# Altium footprint library Elettronica FM.PcbLib: 387 footprints (part 8 of 25)
Each footprint in its own frame and in the unit in brackets; x right, y up, seen from the top. Pads: shape width x height; smd on the part's side, far side on the other; paste and mask are expansions set on the pad; w line width, h text height; cw(c..) or ccw(c..) is an arc to the next point about the centre after c.
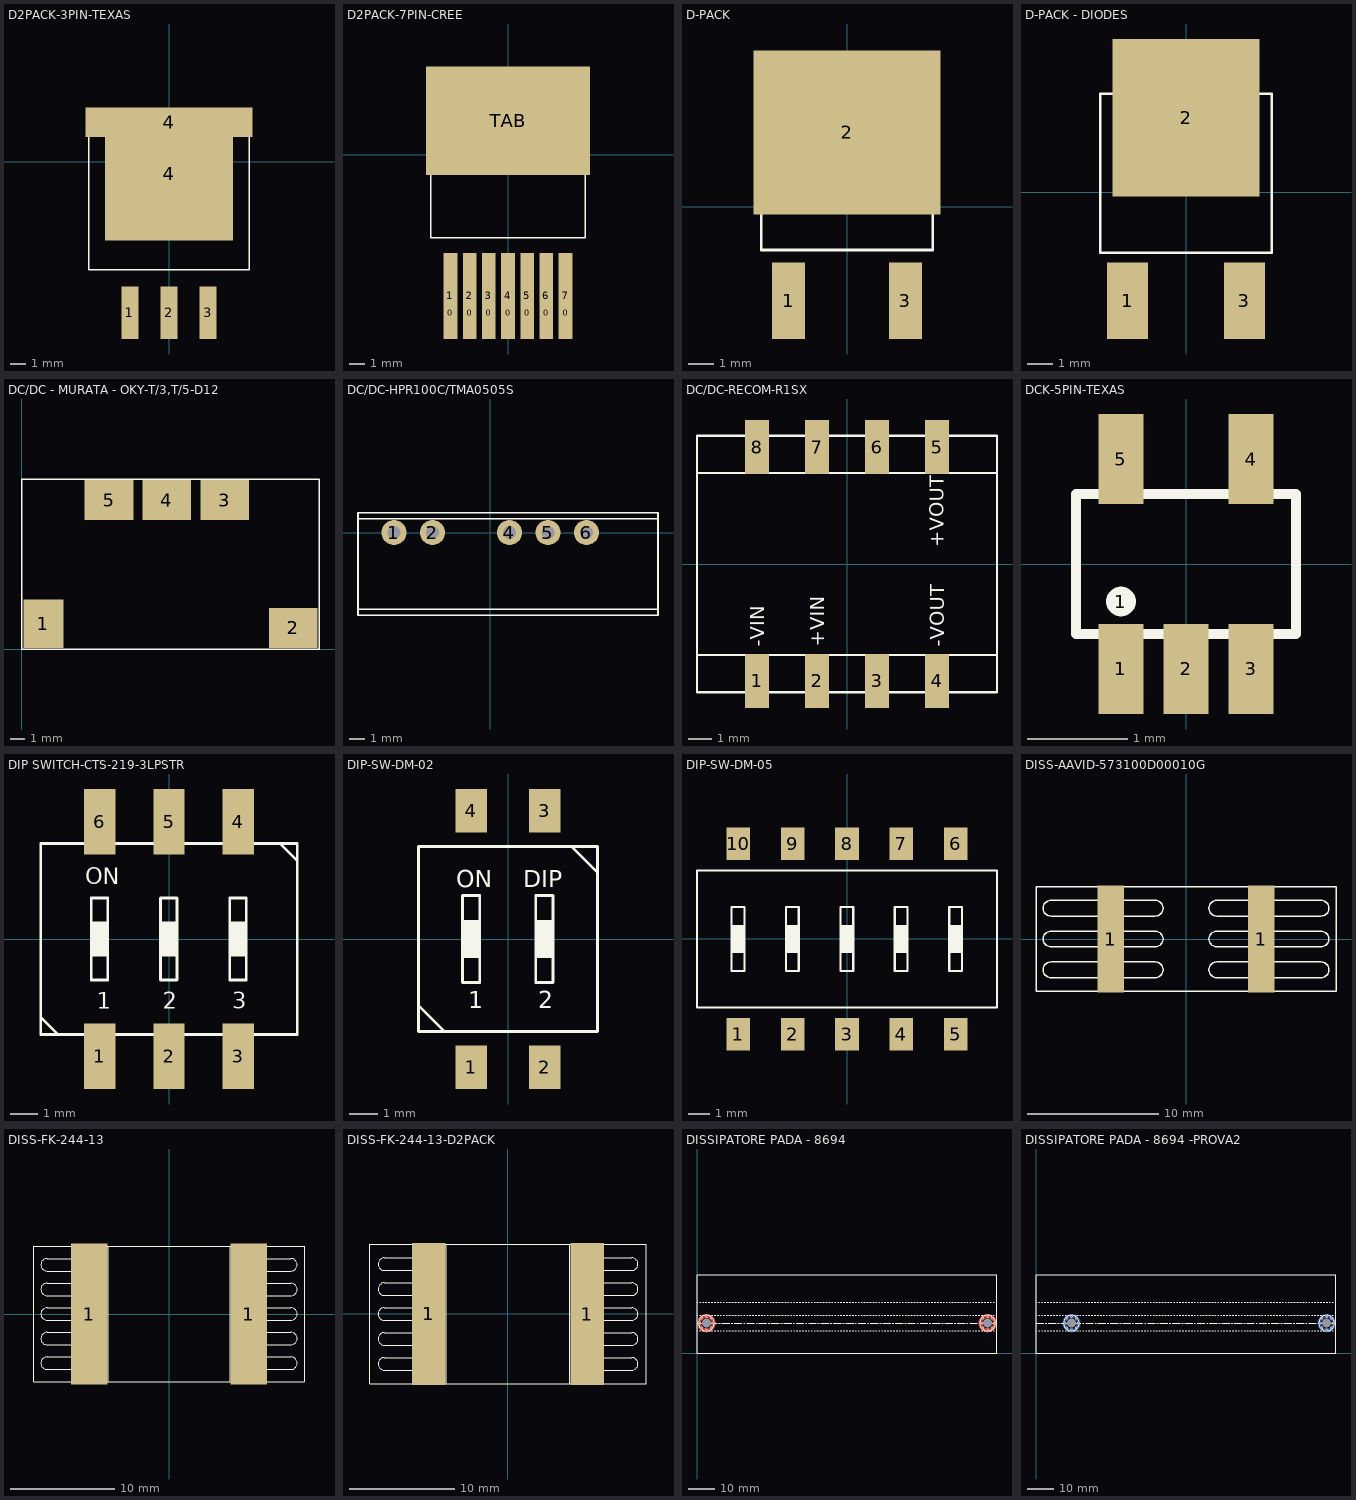
[diagram p7: the footprints below, top view; thin cyan lines are the x and y axes]

## D2PACK-3PIN-TEXAS [mm]
pads (5):
  rect 1.1x3.4 smd: 1(-2.54,-9.8) 2(0,-9.8) 3(2.54,-9.8)
  rect 8.3x8.6 smd: 4(0,-0.8)
  rect 10.8x1.9 smd: 4(0,2.55)
Top Overlay:
  lines w0.1: -5.2,1.9 -5.2,3.2 5.2,3.2 5.2,1.9 ; -5.2,1.9 5.2,1.9 ; -5.2,1.9 -5.2,-7 5.2,-7 5.2,1.9
3D body: height 3.25, standoff 2.6, extent 2.095,-9.075 2.955,-6.275
3D body: height 3.25, standoff 0, extent 2.095,-9.075 2.955,-8.425
3D body: height 0.65, standoff 0, extent 2.095,-11.125 2.955,-8.425
3D body: height 0.65, standoff 0, extent -2.955,-11.125 -2.095,-8.425
3D body: height 3.25, standoff 0, extent -2.955,-9.075 -2.095,-8.425
3D body: height 3.25, standoff 2.6, extent -2.955,-9.075 -2.095,-6.275
3D body: height 4.6, standoff 0, extent -5.2,-7.5 5.2,1.9
3D body: height 1.4, standoff 0, extent -5.2,1.9 5.2,3.2
3D body: height 3.25, standoff 2.6, extent -0.415,-9.075 0.445,-6.275
3D body: height 3.25, standoff 0, extent -0.415,-9.075 0.445,-8.425
3D body: height 0.65, standoff 0, extent -0.415,-11.125 0.445,-8.425

## D2PACK-7PIN-CREE [mm]
pads (15):
  rect 0.7x2.7 on Top Overlay mask+0.1: 0(-3.81,-10.45) 0(-2.54,-10.45) 0(-1.27,-10.45) 0(0,-10.45) 0(1.27,-10.45) 0(2.54,-10.45) 0(3.81,-10.45)
  rect 0.9x5.7 smd: 1(-3.81,-9.35) 2(-2.54,-9.35) 3(-1.27,-9.35) 4(0,-9.35) 5(1.27,-9.35) 6(2.54,-9.35) 7(3.81,-9.35)
  rect 10.85x7.2 smd mask-500: TAB(0,2.25)
Top Overlay:
  lines w0.1: -5.125,3.6 5.125,3.6 ; -3.85,-0.95 -3.85,-1.25 -3.55,-1.25 ; -3.85,-0.65 -3.85,-0.35 ; -3.85,-0.05 -3.85,0.25 ; -3.85,0.55 -3.85,0.85 ; -3.85,1.15 -3.85,1.45 ; -3.85,1.75 -3.85,2.05 ; -3.85,2.35 -3.85,2.65 ; -3.85,2.95 -3.85,3.25 ; -3.85,3.55 -3.85,3.6 ; -3.65,-1.25 -3.35,-1.25 ; -3.05,-1.25 -2.75,-1.25 ; -2.45,-1.25 -2.15,-1.25 ; -1.85,-1.25 -1.55,-1.25 ; -1.25,-1.25 -0.95,-1.25 ; -0.65,-1.25 -0.35,-1.25 ; -0.05,-1.25 0.25,-1.25 ; 0.55,-1.25 0.85,-1.25 ; 1.15,-1.25 1.45,-1.25 ; 1.75,-1.25 2.05,-1.25 ; 2.35,-1.25 2.65,-1.25 ; 2.95,-1.25 3.25,-1.25 ; 3.55,-1.25 3.85,-1.25 3.85,-0.95 ; 3.85,-0.65 3.85,-0.35 ; 3.85,-0.05 3.85,0.25 ; 3.85,0.55 3.85,0.85 ; 3.85,1.15 3.85,1.45 ; 3.85,1.75 3.85,2.05 ; 3.85,2.35 3.85,2.65 ; 3.85,2.95 3.85,3.25 ; 3.85,3.55 3.85,3.6 ; -5.125,-5.5 5.125,-5.5 5.125,5 4.625,5.5 -4.625,5.5 -5.125,5 -5.125,-5.5
Top Solder:
  region: -5.425,5.85 5.425,5.85 5.425,3.5 3.95,3.5 3.95,-1.35 -3.95,-1.35 -3.95,3.5 -5.425,3.5
3D body: height 0.65, standoff 0, extent -4.16,-11.8 -3.46,-9.1
3D body: height 3.25, standoff 0, extent -4.16,-9.75 -3.46,-9.1
3D body: height 3.25, standoff 2.6, extent -4.16,-9.75 -3.46,-5.5
3D body: height 0.65, standoff 0, extent -2.89,-11.8 -2.19,-9.1
3D body: height 3.25, standoff 0, extent -2.89,-9.75 -2.19,-9.1
3D body: height 3.25, standoff 2.6, extent -2.89,-9.75 -2.19,-5.5
3D body: height 0.65, standoff 0, extent -1.62,-11.8 -0.92,-9.1
3D body: height 3.25, standoff 0, extent -1.62,-9.75 -0.92,-9.1
3D body: height 3.25, standoff 2.6, extent -1.62,-9.75 -0.92,-5.5
3D body: height 0.65, standoff 0, extent 3.46,-11.8 4.16,-9.1
3D body: height 3.25, standoff 0, extent 3.46,-9.75 4.16,-9.1
3D body: height 3.25, standoff 2.6, extent 3.46,-9.75 4.16,-5.5
3D body: height 0.65, standoff 0, extent 2.19,-11.8 2.89,-9.1
3D body: height 3.25, standoff 0, extent 2.19,-9.75 2.89,-9.1
3D body: height 3.25, standoff 2.6, extent 2.19,-9.75 2.89,-5.5
3D body: height 0.65, standoff 0, extent 0.92,-11.8 1.62,-9.1
3D body: height 3.25, standoff 0, extent 0.92,-9.75 1.62,-9.1
3D body: height 3.25, standoff 2.6, extent 0.92,-9.75 1.62,-5.5
3D body: height 3.25, standoff 2.6, extent -0.35,-9.75 0.35,-5.5
3D body: height 3.25, standoff 0, extent -0.35,-9.75 0.35,-9.1
3D body: height 1.4, standoff 0, extent -5.125,3.6 5.125,5.5
3D body: height 4.6, standoff 0, extent -5.125,-5.5 5.125,3.6
3D body: height 0.65, standoff 0, extent -0.35,-11.8 0.35,-9.1

## D-PACK [mm]
pads (3):
  rect 1.3x3 smd: 1(-2.3,-3.7) 3(2.3,-3.7)
  rect 7.35x6.45 smd mask-50: 2(0,2.925)
Top Overlay:
  lines w0.1: -3.375,4.55 3.375,4.55 ; -2.6,0.15 -2.6,0 -2.275,0 ; -2.6,0.35 -2.6,0.55 ; -2.6,0.75 -2.6,0.95 ; -2.6,1.15 -2.6,1.35 ; -2.6,1.55 -2.6,1.75 ; -2.6,1.95 -2.6,2.15 ; -2.6,2.35 -2.6,2.55 ; -2.6,2.75 -2.6,2.95 ; -2.6,3.15 -2.6,3.35 ; -2.6,3.55 -2.6,3.75 ; -2.6,3.95 -2.6,4.15 ; -2.6,4.35 -2.6,4.55 ; -2.075,0 -1.875,0 ; -1.675,0 -1.475,0 ; -1.275,0 -1.075,0 ; -0.875,0 -0.675,0 ; -0.475,0 -0.275,0 ; -0.075,0 0.125,0 ; 0.325,0 0.525,0 ; 0.725,0 0.925,0 ; 1.125,0 1.325,0 ; 1.525,0 1.725,0 ; 1.925,0 2.125,0 ; 2.325,0 2.6,0 2.6,0.15 ; 2.6,0.35 2.6,0.55 ; 2.6,0.75 2.6,0.95 ; 2.6,1.15 2.6,1.35 ; 2.6,1.55 2.6,1.75 ; 2.6,1.95 2.6,2.15 ; 2.6,2.35 2.6,2.55 ; 2.6,2.75 2.6,2.95 ; 2.6,3.15 2.6,3.35 ; 2.6,3.55 2.6,3.75 ; 2.6,3.95 2.6,4.15 ; 2.6,4.35 2.6,4.55 ; -3.375,-1.7 3.375,-1.7 3.375,5.85 -3.375,5.85 -3.375,-1.7
Top Solder:
  region: -3.775,4.45 -2.7,4.45 -2.7,-0.1 2.7,-0.1 2.7,4.45 3.775,4.45 3.775,6.25 -3.775,6.25
3D body: height 1.58, standoff 0, extent 1.85,-3.45 2.75,-2.85
3D body: height 1.58, standoff 0.97, extent 1.85,-3.45 2.75,-1.475
3D body: height 1.58, standoff 0.97, extent -2.75,-3.45 -1.85,-1.475
3D body: height 1.58, standoff 0, extent -2.75,-3.45 -1.85,-2.85
3D body: height 0.6, standoff 0, extent 1.85,-4.65 2.75,-2.85
3D body: height 2.55, standoff 0, extent -3.375,-1.7 3.375,4.55
3D body: height 1.15, standoff 0, extent -3.375,4.55 3.375,5.85
3D body: height 0.6, standoff 0, extent -2.75,-4.65 -1.85,-2.85

## D-PACK - DIODES [mm]
pads (3):
  rect 1.6x3 smd: 1(-2.3,-4.275) 3(2.3,-4.275)
  rect 5.8x6.2 smd mask+0.1: 2(0,2.925)
Top Overlay:
  lines w0.1: -2.725,3.875 -2.725,5.525 2.725,5.525 2.725,3.875 ; -3.375,-2.375 3.375,-2.375 3.375,3.875 -3.375,3.875 -3.375,-2.375
3D body: height 1.58, standoff 0, extent 1.85,-3.675 2.75,-3.075
3D body: height 1.58, standoff 0.97, extent 1.85,-3.675 2.75,-2.15
3D body: height 1.58, standoff 0.97, extent -2.75,-3.675 -1.85,-2.15
3D body: height 1.58, standoff 0, extent -2.75,-3.675 -1.85,-3.075
3D body: height 0.6, standoff 0, extent 1.85,-4.875 2.75,-3.075
3D body: height 2.55, standoff 0, extent -3.375,-2.375 3.375,3.875
3D body: height 1.15, standoff 0, extent -2.725,3.875 2.725,5.525
3D body: height 0.6, standoff 0, extent -2.75,-4.875 -1.85,-3.075

## DC/DC - MURATA - OKY-T/3,T/5-D12 [mm]
height 1.9
pads (5):
  rect 2.8x3.4 smd mask+0.1: 1(1.5,1.8)
  rect 3.4x2.8 smd mask+0.1: 2(19,1.5) 3(14.2,10.45) 4(10.15,10.45) 5(6.1,10.45)
Top Overlay:
  lines w0.1: 0,0 20.8,0 20.8,11.9 0,11.9 0,0
3D body: height 7, standoff 0, extent 0,0 20.8,11.9

## DC/DC-HPR100C/TMA0505S [mm]
height 1.9
pads (5):
  round 1.65 hole 0.85: 1(-6.35,0) 2(-3.81,0) 4(1.27,0) 5(3.81,0) 6(6.35,0)
Top Overlay:
  lines w0.1: -8.725,-5.05 11.075,-5.05 ; -8.725,0.9 -8.725,-5.45 11.075,-5.45 11.075,0.9 ; -8.725,0.9 11.075,0.9 ; -8.725,0.9 -8.725,1.3 11.075,1.3 11.075,0.9
3D body: height 10.45, standoff 0, extent -8.6,-4.925 10.95,1.175
3D body: height 10.45, standoff 0, extent -8.6,-5.325 10.95,0.775

## DC/DC-RECOM-R1SX [mm]
height 1.9
pads (8):
  rect 1x2.3 smd paste+0 mask+0.05: 1(-3.81,-4.95) 2(-1.27,-4.95) 3(1.27,-4.95) 4(3.81,-4.95) 5(3.81,4.95) 6(1.27,4.95) 7(-1.27,4.95) 8(-3.81,4.95)
Top Overlay:
  lines w0.1: -4.175,-3.85 -4.175,-5.6 -3.45,-5.6 -3.45,-3.85 ; -4.17,3.85 -4.17,5.6 -3.445,5.6 -3.445,3.85 ; -1.635,-3.85 -1.635,-5.6 -0.91,-5.6 -0.91,-3.85 ; 3.445,-3.85 3.445,-5.6 4.17,-5.6 4.17,-3.85 ; 3.45,3.85 3.45,5.6 4.175,5.6 4.175,3.85 ; -6.35,-3.85 6.35,-3.85 ; -6.35,-3.85 -6.35,3.85 ; -6.35,-3.85 -6.35,-5.425 6.35,-5.425 6.35,-3.85 ; -6.35,3.85 6.35,3.85 ; -6.35,3.85 -6.35,5.425 6.35,5.425 6.35,3.85 ; 6.35,-3.85 6.35,3.85
  text "+VOUT" at 4.1,0.7 h0.6
  text "-VOUT" at 4.12,-3.5 h0.6
  text "+VIN" at -0.96,-3.5 h0.6
  text "-VIN" at -3.5,-3.5 h0.6
3D body: height 7, standoff 0, extent -6.35,-3.85 6.35,3.85

## DCK-5PIN-TEXAS [mm]
height 1.9
pads (6):
  rect 0.45x0.9 smd paste-0.05 mask+0.05: 1(-0.65,-1.05) 2(0,-1.05) 3(0.65,-1.05) 4(0.65,1.05) 5(-0.65,1.05)
  round 0.3 on Top Overlay mask+0.1: 1(-0.65,-0.375)
Top Overlay:
  lines w0.1: -1.1,-0.7 -1.1,0.7 1.1,0.7 1.1,-0.7 -1.1,-0.7
3D body: height 1.1, standoff 0, extent -1.1,-0.7 1.1,0.7

## DIP SWITCH-CTS-219-3LPSTR [mm]
pads (6):
  rect 1.15x2.4 smd: 1(-2.54,-4.3) 2(0,-4.3) 3(2.54,-4.3) 4(2.54,4.3) 5(0,4.3) 6(-2.54,4.3)
Top Overlay:
  rectangle: -2.85,-0.6 -2.25,0.6
  rectangle: -0.31,-0.6 0.29,0.6
  rectangle: 2.23,-0.6 2.83,0.6
  lines w0.1: -4.7,-2.875 -4.075,-3.5 ; 4.075,3.5 4.7,2.875 ; -2.85,-0.6 -2.85,-1.5 -2.25,-1.5 -2.25,-0.6 ; -2.85,-0.6 -2.25,-0.6 ; -2.85,-0.6 -2.85,0.6 ; -2.85,0.6 -2.85,1.5 -2.25,1.5 -2.25,0.6 ; -2.85,0.6 -2.25,0.6 ; -2.25,-0.6 -2.25,0.6 ; -0.31,-0.6 -0.31,-1.5 0.29,-1.5 0.29,-0.6 ; -0.31,-0.6 0.29,-0.6 ; -0.31,-0.6 -0.31,0.6 ; -0.31,0.6 -0.31,1.5 0.29,1.5 0.29,0.6 ; -0.31,0.6 0.29,0.6 ; 0.29,-0.6 0.29,0.6 ; 2.23,-0.6 2.23,-1.5 2.83,-1.5 2.83,-0.6 ; 2.23,-0.6 2.83,-0.6 ; 2.23,-0.6 2.23,0.6 ; 2.23,0.6 2.23,1.5 2.83,1.5 2.83,0.6 ; 2.23,0.6 2.83,0.6 ; 2.83,-0.6 2.83,0.6 ; -4.7,-3.5 4.7,-3.5 4.7,3.5 -4.7,3.5 -4.7,-3.5
  text "ON" at -3.075,2 h0.6
  text "3" at 2.325,-2.55 h0.6
  text "2" at -0.225,-2.55 h0.6
  text "1" at -2.65,-2.55 h0.6
3D body: height 4.1, standoff 0.35, extent -4.7,-3.5 4.7,3.5

## DIP-SW-DM-02 [mm]
pads (4):
  rect 1.1x1.5 smd: 1(-1.27,-4.445) 2(1.27,-4.445) 3(1.27,4.445) 4(-1.27,4.445)
Top Overlay:
  rectangle: 0.96,-0.6 1.56,0.6
  rectangle: -1.58,-0.6 -0.98,0.6
  lines w0.1: -3.1,-2.3 -2.2,-3.2 ; 2.2,3.2 3.1,2.3 ; -1.58,-0.6 -1.58,-1.5 -0.98,-1.5 -0.98,-0.6 ; -1.58,-0.6 -0.98,-0.6 ; -1.58,-0.6 -1.58,0.6 ; -1.58,0.6 -1.58,1.5 -0.98,1.5 -0.98,0.6 ; -1.58,0.6 -0.98,0.6 ; -0.98,-0.6 -0.98,0.6 ; 0.96,-0.6 0.96,0.6 ; 0.96,-0.6 1.56,-0.6 ; 0.96,-0.6 0.96,-1.5 1.56,-1.5 1.56,-0.6 ; 0.96,0.6 1.56,0.6 ; 0.96,0.6 0.96,1.5 1.56,1.5 1.56,0.6 ; 1.56,-0.6 1.56,0.6 ; -3.1,-3.2 -3.1,3.2 3.1,3.2 3.1,-3.2 -3.1,-3.2
  text "ON" at -1.8,1.8 h0.6
  text "DIP" at 0.525,1.8 h0.6
  text "1" at -1.375,-2.4 h0.6
  text "2" at 1.05,-2.4 h0.6
3D body: height 5, standoff 0, extent -3.1,-3.2 3.1,3.2

## DIP-SW-DM-05 [mm]
pads (10):
  rect 1.1x1.5 smd: 1(-5.08,-4.445) 2(-2.54,-4.445) 3(0,-4.445) 4(2.54,-4.445) 5(5.08,-4.445) 6(5.08,4.445) 7(2.54,4.445) 8(0,4.445) 9(-2.54,4.445) 10(-5.08,4.445)
Top Overlay:
  rectangle: 4.77,-0.6 5.37,0.6
  rectangle: 2.23,-0.6 2.83,0.6
  rectangle: -0.31,-0.6 0.29,0.6
  rectangle: -2.85,-0.6 -2.25,0.6
  rectangle: -5.39,-0.6 -4.79,0.6
  lines w0.1: -5.39,-0.6 -5.39,-1.5 -4.79,-1.5 -4.79,-0.6 ; -5.39,-0.6 -4.79,-0.6 ; -5.39,-0.6 -5.39,0.6 ; -5.39,0.6 -5.39,1.5 -4.79,1.5 -4.79,0.6 ; -5.39,0.6 -4.79,0.6 ; -4.79,-0.6 -4.79,0.6 ; -2.85,-0.6 -2.85,0.6 ; -2.85,-0.6 -2.25,-0.6 ; -2.85,-0.6 -2.85,-1.5 -2.25,-1.5 -2.25,-0.6 ; -2.85,0.6 -2.25,0.6 ; -2.85,0.6 -2.85,1.5 -2.25,1.5 -2.25,0.6 ; -2.25,-0.6 -2.25,0.6 ; -0.31,-0.6 -0.31,0.6 ; -0.31,-0.6 0.29,-0.6 ; -0.31,-0.6 -0.31,-1.5 0.29,-1.5 0.29,-0.6 ; -0.31,0.6 0.29,0.6 ; -0.31,0.6 -0.31,1.5 0.29,1.5 0.29,0.6 ; 0.29,-0.6 0.29,0.6 ; 2.23,-0.6 2.23,0.6 ; 2.23,-0.6 2.83,-0.6 ; 2.23,-0.6 2.23,-1.5 2.83,-1.5 2.83,-0.6 ; 2.23,0.6 2.83,0.6 ; 2.23,0.6 2.23,1.5 2.83,1.5 2.83,0.6 ; 2.83,-0.6 2.83,0.6 ; 4.77,-0.6 4.77,0.6 ; 4.77,-0.6 5.37,-0.6 ; 4.77,-0.6 4.77,-1.5 5.37,-1.5 5.37,-0.6 ; 4.77,0.6 5.37,0.6 ; 4.77,0.6 4.77,1.5 5.37,1.5 5.37,0.6 ; 5.37,-0.6 5.37,0.6 ; -7,-3.2 -7,3.2 7,3.2 7,-3.2 -7,-3.2
3D body: height 5, standoff 0, extent -7,-3.2 7,3.2

## DISS-AAVID-573100D00010G [mm]
pads (2):
  rect 2x8.2 smd mask-50: 1(-5.75,0) 1(5.75,0)
Top Overlay:
  lines w0.1: -6.5,-4 -6.5,4 ; -5.2,-4 -5.2,4 ; -2.375,0.6 -10.3,0.6 ccw(c-10.3,0) -10.3,-0.6 -2.35,-0.6 ccw(c-2.35,0) -2.35,0.6 ; 5.2,-4 5.2,4 ; 6.5,-4 6.5,4 ; -11.45,-4 11.45,-4 11.45,4 -11.45,4 -11.45,-4 ; -10.3,-2.95 cw(c-10.3,-2.35) -10.3,-1.75 -2.35,-1.75 cw(c-2.35,-2.35) -2.35,-2.95 -10.3,-2.95 ; -10.3,1.75 cw(c-10.3,2.35) -10.3,2.95 -2.35,2.95 cw(c-2.35,2.35) -2.35,1.75 -10.3,1.75 ; 2.35,-2.95 cw(c2.35,-2.35) 2.35,-1.75 10.3,-1.75 cw(c10.3,-2.35) 10.3,-2.95 2.35,-2.95 ; 2.35,-0.6 cw(c2.35,0) 2.35,0.6 10.3,0.6 cw(c10.3,0) 10.3,-0.6 2.35,-0.6 ; 2.35,1.75 cw(c2.35,2.35) 2.35,2.95 10.3,2.95 cw(c10.3,2.35) 10.3,1.75 2.35,1.75
Top Solder:
  region: -6.75,4.2 -6.75,-4.2 -4.65,-4.2 -4.65,4.2
  region: 6.75,4.2 6.75,-4.2 4.65,-4.2 4.65,4.2
3D body: height 10.15, standoff 0, extent -6.5,-4 -5.2,4
3D body: height 10.15, standoff 0, extent 5.2,-4 6.5,4
3D body: height 10.15, standoff 9.5, extent -11.45,-4 11.45,4

## DISS-FK-244-13 [mm]
pads (2):
  rect 3.5x13.5 smd: 1(-7.65,0) 1(7.65,0)
Top Overlay:
  lines w0.1: -8.899,-6.5 -8.899,-5.32 -8.899,-4.12 -8.899,-2.96 -8.899,-1.76 -8.899,-0.6 -8.899,0.6 -8.899,1.76 -8.899,2.96 -8.899,4.12 -8.899,5.32 -8.899,6.5 ; -7.099,-6.5 -7.099,6.5 ; -6.499,-6.5 -6.499,6.5 ; 6.501,-6.5 6.501,6.5 ; 7.101,-6.5 7.101,6.5 ; 8.901,-6.5 8.901,-5.32 8.901,-4.12 8.901,-2.96 8.901,-1.76 8.901,-0.6 8.901,0.6 8.901,1.76 8.901,2.96 8.901,4.12 8.901,5.32 8.901,6.5 ; -5.83,-6.5 -5.83,6.5 ; -5.83,-6.5 -5.649,-6.5 5.651,-6.5 5.832,-6.5 ; -5.83,-6.5 -5.998,-6.5 -7.449,-6.5 -12.399,-6.5 -13,-6.5 -13,6.5 -12.399,6.5 -7.449,6.5 -5.998,6.5 -5.83,6.5 ; -5.83,6.5 -5.649,6.5 5.651,6.5 5.832,6.5 ; 5.832,-6.5 5.832,6.5 ; 5.832,-6.5 6,-6.5 7.45,-6.5 12.401,-6.5 13.002,-6.5 13.002,6.5 12.401,6.5 7.45,6.5 6,6.5 5.832,6.5 ; -11.699,-5.32 cw(c-11.699,-4.72) -11.699,-4.12 -8.199,-4.12 cw(c-8.199,-4.72) -8.199,-5.32 -11.699,-5.32 ; -11.699,-2.96 cw(c-11.699,-2.36) -11.699,-1.76 -8.199,-1.76 cw(c-8.199,-2.36) -8.199,-2.96 -11.699,-2.96 ; -11.699,-0.6 cw(c-11.699,0) -11.699,0.6 -8.199,0.6 cw(c-8.199,0) -8.199,-0.6 -11.699,-0.6 ; -11.699,1.76 cw(c-11.699,2.36) -11.699,2.96 -8.199,2.96 cw(c-8.199,2.36) -8.199,1.76 -11.699,1.76 ; -11.699,4.12 cw(c-11.699,4.72) -11.699,5.32 -8.199,5.32 cw(c-8.199,4.72) -8.199,4.12 -11.699,4.12 ; 8.201,-5.32 cw(c8.201,-4.72) 8.201,-4.12 11.701,-4.12 cw(c11.701,-4.72) 11.701,-5.32 8.201,-5.32 ; 8.201,-2.96 cw(c8.201,-2.36) 8.201,-1.76 11.701,-1.76 cw(c11.701,-2.36) 11.701,-2.96 8.201,-2.96 ; 8.201,-0.6 cw(c8.201,0) 8.201,0.6 11.701,0.6 cw(c11.701,0) 11.701,-0.6 8.201,-0.6 ; 8.201,1.76 cw(c8.201,2.36) 8.201,2.96 11.701,2.96 cw(c11.701,2.36) 11.701,1.76 8.201,1.76 ; 8.201,4.12 cw(c8.201,4.72) 8.201,5.32 11.701,5.32 cw(c11.701,4.72) 11.701,4.12 8.201,4.12
3D body "fk_244_13_d2_pak.stp": height 10, standoff 0, extent -13.001,-6.5 13.001,6.5

## DISS-FK-244-13-D2PACK [mm]
height 1.9
pads (2):
  rect 3.2x13.4 smd: 1(-7.5,0) 1(7.5,0)
Top Overlay:
  drawing of 166 lines, arcs and shapes, not listed
3D body "fk_244_13_d2_pak.stp": height 10, standoff 0, extent -13.001,-6.5 13.001,6.5

## DISSIPATORE PADA - 8694 [mm]
pads (18):
  round 0 hole 3.4 unplated mask-5: 0(3.6,11.5) 0(111.4,11.5)
  round 1 hole 0.5: 1(1.05,11.5) 1(1.797,9.697) 1(1.797,13.303) 1(3.6,8.95) 1(3.6,14.05) 1(5.403,9.697) 1(5.403,13.303) 1(6.15,11.5) 1(108.85,11.5) 1(109.597,9.697) 1(109.597,13.303) 1(111.4,8.95) 1(111.4,14.05) 1(113.203,9.697) 1(113.203,13.303) 1(113.95,11.5)
Top Layer:
  circle w1.45: c111.4,11.5 r2.775
  circle w1.45: c3.6,11.5 r2.775
Bottom Layer:
  circle w1.45: c111.4,11.5 r2.775
  circle w1.45: c3.6,11.5 r2.775
Top Overlay:
  drawing of 364 lines, arcs and shapes, not listed
Bottom Overlay:
  circle w0.1: c111.4,11.5 r3.5
  circle w0.1: c3.6,11.5 r3.5
Top Solder:
  circle w1.45: c111.4,11.5 r2.775
  circle w1.45: c3.6,11.5 r2.775
3D body "8694_115mm.stp": height 45, standoff 0, extent 0,0.005 115,30

## DISSIPATORE PADA - 8694 -PROVA2 [mm]
pads (18):
  round 0 hole 3.4 unplated mask-5: 0(13.6,11.5) 0(111.4,11.5)
  round 1 hole 0.5: 1(11.05,11.5) 1(11.797,9.697) 1(11.797,13.303) 1(13.6,8.95) 1(13.6,14.05) 1(15.403,9.697) 1(15.403,13.303) 1(16.15,11.5) 1(108.85,11.5) 1(109.597,9.697) 1(109.597,13.303) 1(111.4,8.95) 1(111.4,14.05) 1(113.203,9.697) 1(113.203,13.303) 1(113.95,11.5)
Bottom Layer:
  circle w1.45: c13.6,11.5 r2.775
  circle w1.45: c111.4,11.5 r2.775
Top Overlay:
  drawing of 364 lines, arcs and shapes, not listed
Bottom Overlay:
  circle w0.1: c13.6,11.5 r3.5
  circle w0.1: c111.4,11.5 r3.5
Top Solder:
  circle w1.45: c13.6,11.5 r2.775
  circle w1.45: c111.4,11.5 r2.775
3D body "8694_115mm.stp": height 45, standoff 0, extent 0,0.005 115,30